# Altium footprint library Udemy_Library.PcbLib: 35 footprints (part 3 of 3)
Each footprint in its own frame and in the unit in brackets; x right, y up, seen from the top. Pads: shape width x height; smd on the part's side, far side on the other; paste and mask are expansions set on the pad; w line width, h text height; cw(c..) or ccw(c..) is an arc to the next point about the centre after c.
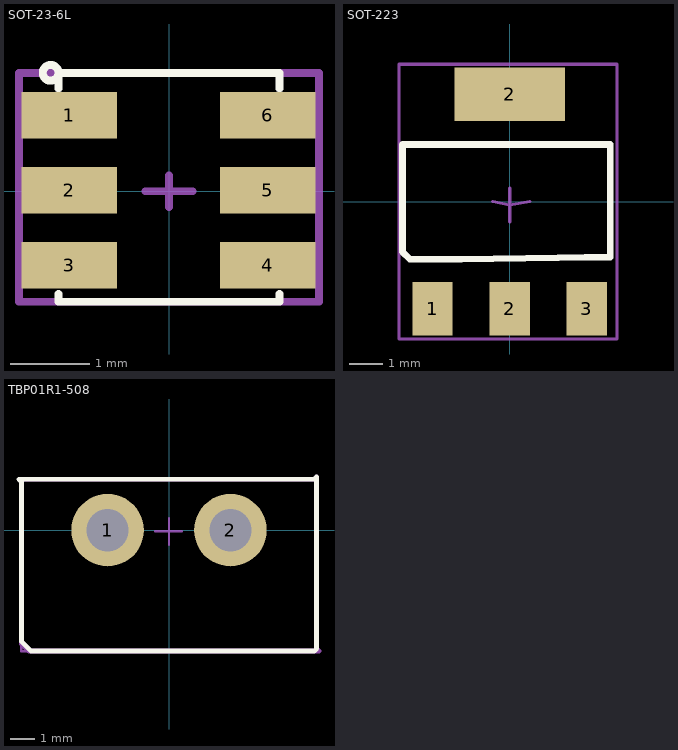
[diagram p2: the footprints below, top view; thin cyan lines are the x and y axes]

## SOT-23-6L [mm]
pads (6):
  rect 1.21x0.59 smd mask+0.05: 1(-1.261,0.962) 2(-1.261,0.012) 3(-1.261,-0.938) 4(1.249,-0.938) 5(1.249,0.012) 6(1.249,0.962)
Top Overlay:
  circle w0.1: c-1.5,1.5 r0.1
  lines w0.1: -1.4,-1.3 -1.4,-1.4 1.4,-1.4 1.4,-1.305 1.399,-1.304 ; -1.4,1.3 -1.4,1.5 1.4,1.5 1.4,1.3
Top Component Center:
  lines w0.1: -1.9,1.5 -1.9,-1.4 1.9,-1.4 1.9,1.5 -1.8,1.5 ; 0,-0.2 0,0.2 ; 0.3,0 0,0 ; 0,0 -0.3,0 0,0
Top Designator:
  lines w0.1: -1.9,-1.4 1.9,-1.4 1.9,1.5 -1.9,1.5 -1.9,-1.4
  text ".Designator" at -1.6,-0.133 h0.8
3D body "USBLC6-2SC6.STEP": height 1.4, standoff -0.05, extent -1.4,-1.425 1.4,1.5

## SOT-223 [mm] "SOT223"
pads (4):
  rect 1.2x1.6 smd mask+0.05: 1(-2.3,-3.2) 2(0,-3.2) 3(2.3,-3.2)
  rect 3.3x1.6 smd mask+0.05: 2(0,3.2)
Top Overlay:
  lines w0.2: -3.2,-1.5 -2.979,-1.721 -1.451,-1.721 1.446,-1.676 3,-1.652 3,-0.611 3,0.663 3,1.7 -3.2,1.7 -3.2,-1.5
Top Component Center:
  lines w0.1: 0,0.4 0,-0.6 0,-0.1 ; 0.6,0 0,-0.1 ; 0,-0.1 -0.5,0 0,-0.1 ; -3.3,-4.1 -3.3,3.8 -3.3,4.1 3.2,4.1 3.2,-4.1 -3.3,-4.1
Top Designator:
  lines w0.1: -3.3,-4.1 3.2,-4.1 3.2,4.1 -3.3,4.1 -3.3,-4.1
  text ".Designator" at -2.7,-0.033 h0.8
3D body "SMT172-SOT223--3DModel-STEP-269445.STEP": height 1.8, standoff 0, extent -3.25,-3.4 3.25,3.6

## TBP01R1-508 [mm]
pads (2):
  round 3 hole 1.75 mask+0.05: 1(-2.54,0) 2(2.54,0)
Top Overlay:
  lines w0.2: -6.2,2.1 -6.1,2 -6.1,-4.6 -5.7,-5 6,-5 6.1,-4.9 6.1,2.2 6,2.1 -6.2,2.1
Top Component Center:
  lines w0.1: -0.574,-0.04 0.526,-0.04 ; 0,-0.6 0,0.5
  lines w0.2: -6.1,-4.7 -6.1,2 -6,2.1 6,2.1 6.1,2.2 6.1,-4.9 6.2,-5 -5.8,-5 -6.1,-4.7
Top Designator:
  lines w0.1: -6.1,-5 6.1,-5 6.1,2 6,2.1 -6.1,2.1 -6.1,-5
  text ".Designator" at -2.2,-0.933 h0.8
3D body "Same_Sky_TBP01R1-508-02BE.step": height 8.5, standoff -4, extent -6,-10.1 5.76,1.9